# Altium integrated library ICs.IntLib: 88 symbols (part 1 of 2) (continued)
## LM5111-1M
designator U?
MosFET gate driver, 5A; Deliverer PartNr: 8238693; Manufacturer: TI; Deliverer: Farnell; TDE-PN: IC0066; Published: 11.11.2015; PackageDescription: SOIC8; Publisher: Sebastian Kulik; Manufacturer PartNr: LM5111-1M
footprint SOIC8_N (SOIC, 8-Leads, Body 4.9x3.9mm, Pitch 1.27mm, IPC Medium Density)
pins: 1 NC, 2 IN_A, 3 Vee, 4 IN_B, 5 OUT_B, 6 Vcc, 7 OUT_A, 8 NC (power)

## LM5111-1M_1
designator U?, comment LM5111-1M
MosFET gate driver, 5A; Deliverer PartNr: 8238693; Manufacturer: TI; Deliverer: Farnell; TDE-PN: IC0066; Published: 11.11.2015; PackageDescription: SOIC8; Publisher: Sebastian Kulik; Manufacturer PartNr: LM5111-1M
footprint SOIC8_N (SOIC, 8-Leads, Body 4.9x3.9mm, Pitch 1.27mm, IPC Medium Density)
pins: 1 NC, 2 IN_A, 3 Vee, 4 IN_B, 5 OUT_B, 6 Vcc, 7 OUT_A, 8 NC (power)

## LM5116HJD
designator U?
Step-Down controller, wide range input, HT; Deliverer PartNr: 595-LM5116HJD; Manufacturer: TI; Deliverer: Mouser; TDE-PN: IC0074; Published: 02.05.2016; PackageDescription: DIP-20-Ceramic-HT; Publisher: Sebastian Kulik; Manufacturer PartNr: LM5116HJD; Price: 156.14/1
footprint DIP-20-Ceramic-HT (DIP; 20 Leads; Row Spacing 7.62 mm; Pitch 2.54 mm)
pins: 1 Vin, 2 UVLO, 3 RT/Sync, 4 EN, 5 RAMP, 6 AGND, 7 SS, 8 FB, 9 COMP, 10 Vout, 11 DEMB, 12 CS, 13 CSG, 14 PGND, 15 LO, 16 VCC, 17 VCCX, 18 HB, 19 HO, 20 SW

## LM5116MH
designator U?
Step-Down controller, wide range input; Deliverer PartNr: 761-5996; Manufacturer: TI; Deliverer: RS; TDE-PN: IC0074; Published: 21.04.2016; PackageDescription: Honeywell-SO8; Publisher: Sebastian Kulik; Manufacturer PartNr: LM5116MH
footprint PWP0020A
pins: 1 Vin, 2 UVLO, 3 RT/Sync, 4 EN, 5 RAMP, 6 AGND, 7 SS, 8 FB, 9 COMP, 10 Vout, 11 DEMB, 12 CS, 13 CSG, 14 PGND, 15 LO, 16 VCC, 17 VCCX, 18 HB, 19 HO, 20 SW, 21 Thermal

## LM22670MR-ADJ
designator U?
TI, step down converter, 3A max; Deliverer PartNr: 1657735; Deliverer: Farnell; TDE-PN: IC0020; Published: 26.03.2014; PackageDescription: PSOP8; Publisher: Sebastian Kulik; Manufacturer PartNr: LM22670MR-ADJ; Manufacturer: TI
footprint PSOP8 (SOIC, 8-Leads, Body 4.9x3.9mm, Pitch 1.27mm, IPC High Density)
pins: 1 BOOT, 3 SYNC, 4 FB (power), 7 VIN, 8 SW, 9 GND

## LM22673MR-ADJ
designator U?
TI, step down converter, 3A max; Deliverer PartNr: 1657736; Deliverer: Farnell; TDE-PN: IC0021; Published: 28.03.2014; PackageDescription: PSOP8; Publisher: Sebastian Kulik; Manufacturer PartNr: LM22673MR-ADJ; Manufacturer: TI
footprint PSOP8 (SOIC, 8-Leads, Body 4.9x3.9mm, Pitch 1.27mm, IPC High Density)
pins: 1 BOOT, 3 SYNC, 4 FB (power), 7 VIN, 8 SW, 9 GND

## MAX3232CSE
designator U?
RS232 transceiver; Deliverer PartNr: 9725490; Manufacturer PartNr: MAX3232CSE+; Manufacturer: Maxim; Deliverer: Farnell; TDE-PN: IC0044; Published: 14.03.2014; PackageDescription: SOIC16_L; Publisher: Sebastian Kulik
footprint SOIC16_L (SOIC, 16-Leads, Body 9.9x3.9mm, Pitch 1.27mm, IPC High Density)
pins: 1 C1+, 2 V+, 3 C1-, 4 C2+, 5 C2-, 6 V-, 7 T2OUT, 8 R2IN, 9 R2OUT, 10 T2IN, 11 T1IN, 12 R1OUT, 13 R1IN, 14 T1OUT, 15 GND, 16 VCC

## MC7805ACTG
designator U?
LDO, 5V; Deliverer PartNr: 9664505; Manufacturer PartNr: ADM811LARTZ-REEL7; Manufacturer: ON-Semi; Deliverer: Farnell; TDE-PN: IC0055; Published: 04.11.2014; PackageDescription: TO220-3; Publisher: Sebastian Kulik
footprint TO220-3
pins: GND, VIN Vin, VOUT Vout (power)

## MCP23017-E/SO
designator U?
I2C mux, 16 bit; Deliverer PartNr: 1332087; Manufacturer: Microchip; Deliverer: Farnell; TDE-PN: IC0049; Published: 23.05.2014; PackageDescription: SSOP28; Publisher: Sebastian Kulik; Manufacturer PartNr: MCP23017-E/SO
footprint SSOP-28 (SSOP, Plastic; 28 Leads; Body Width 5.2 mm; Pitch 0.65 mm)
pins: 1 GPB0, 2 GPB1, 3 GPB2, 4 GPB3, 5 GPB4, 6 GPB5, 7 GPB6, 8 GPB7, 9 Vdd (power), 10 Vss (power), 11 NC (power), 12 SCL, 13 SDA (power), 14 NC, 15 A0, 16 A1, 17 A2, 18 RESET, 19 INTB, 20 INTA, 21 GPA0, 22 GPA1, 23 GPA2, 24 GPA3, 25 GPA4, 26 GPA5, 27 GPA6, 28 GPA7

## MCT5211-X017T
designator U?
OC, low current input; Manufacturer: Vishay; Deliverer: EBV; TDE-PN: IC0053; Published: 07.08.2014; Deliverer PartNr: MCT5211-X017T; PackageDescription: SMD6; Publisher: Sebastian Kulik; Manufacturer PartNr: MCT5211-X017T
footprint SMD-6
pins: 1 A, 2 GND, 3 C, 4 E, 5 C, 6 B

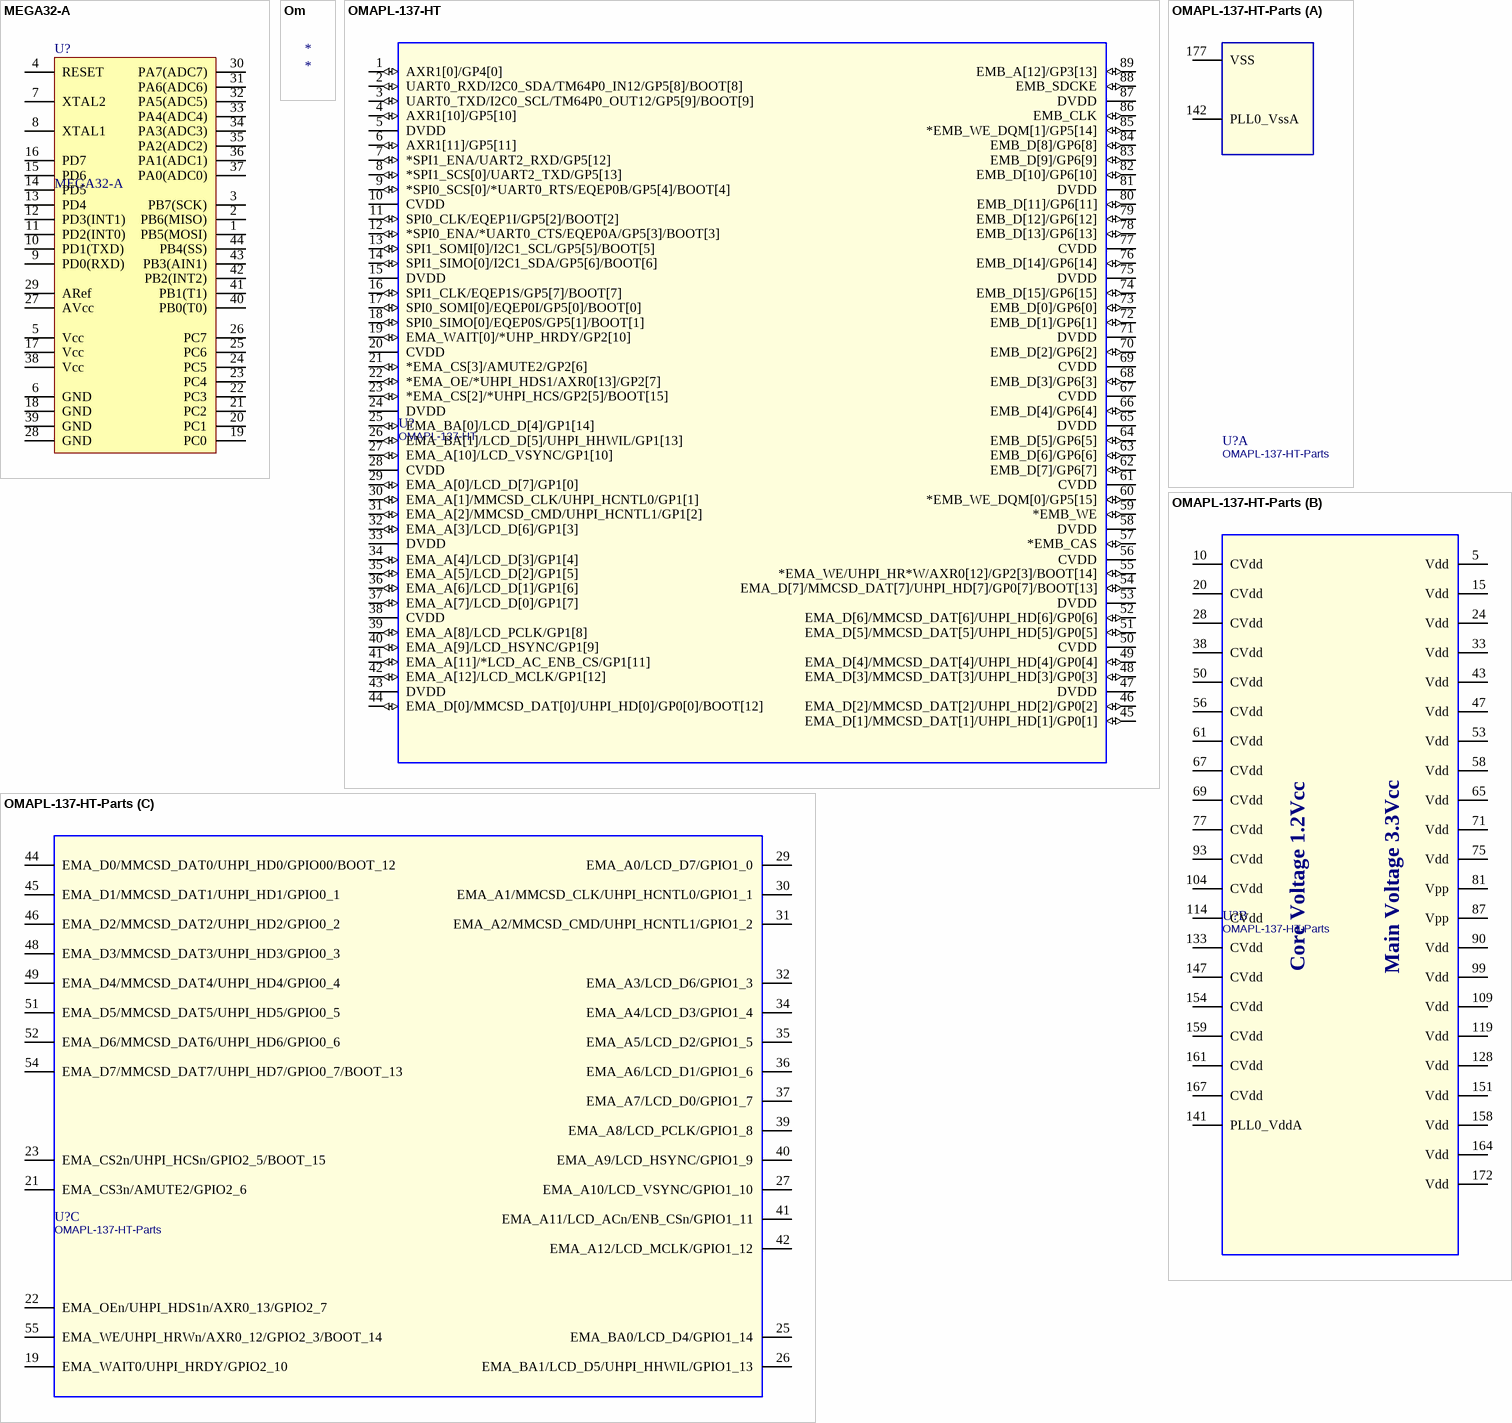
[diagram p3: symbols MEGA32-A to OMAPL-137-HT-Parts]

## MEGA32-A
designator U?
TI, step down converter, 3A max; Manufacturer: Atmel; TDE-PN: IC0057; Published: 10.11.2014; Deliverer PartNr: ?; Deliverer: ?; PackageDescription: TQFP-44; Publisher: Sebastian Kulik; Manufacturer PartNr: ?
footprint TQFP44-N (Thin QFP, 44-Leads, Body 10x10mm, Pitch 0.8mm, IPC Low Density)
pins: 1 PB5(MOSI), 2 PB6(MISO), 3 PB7(SCK), 4 RESET, 5 Vcc, 6 GND, 7 XTAL2, 8 XTAL1, 9 PD0(RXD), 10 PD1(TXD), 11 PD2(INT0), 12 PD3(INT1), 13 PD4, 14 PD5, 15 PD6, 16 PD7, 17 Vcc, 18 GND, 19 PC0, 20 PC1, 21 PC2, 22 PC3, 23 PC4, 24 PC5, 25 PC6, 26 PC7, 27 AVcc, 28 GND, 29 ARef (power), 30 PA7(ADC7), 31 PA6(ADC6), 32 PA5(ADC5), 33 PA4(ADC4), 34 PA3(ADC3), 35 PA2(ADC2), 36 PA1(ADC1), 37 PA0(ADC0), 38 Vcc, 39 GND, 40 PB0(T0), 41 PB1(T1), 42 PB2(INT2), 43 PB3(AIN1), 44 PB4(SS)

## Om
designator *
footprint Om-5mm

## OMAPL-137-HT
designator U?
Manufacturer: TI; Manufacturer PartNr: OMAPL137BPTPH; TDE-PN: IC0081; Deliverer: *; Deliverer PartNr: *; Published: 10.08.2016; Publisher: Sebastian Kulik; Price: *
footprint PTP176_5P73X7P00
footprint PTP176_5P73X7P01
footprint PTP176_5P73X7P31
pins: 1 AXR1[0]/GP4[0] (io), 2 UART0_RXD/I2C0_SDA/TM64P0_IN12/GP5[8]/BOOT[8] (io), 3 UART0_TXD/I2C0_SCL/TM64P0_OUT12/GP5[9]/BOOT[9] (io), 4 AXR1[10]/GP5[10] (io), 5 DVDD (power), 6 AXR1[11]/GP5[11] (io), 7 *SPI1_ENA/UART2_RXD/GP5[12] (io), 8 *SPI1_SCS[0]/UART2_TXD/GP5[13] (io), 9 *SPI0_SCS[0]/*UART0_RTS/EQEP0B/GP5[4]/BOOT[4] (io), 10 CVDD (power), 11 SPI0_CLK/EQEP1I/GP5[2]/BOOT[2] (io), 12 *SPI0_ENA/*UART0_CTS/EQEP0A/GP5[3]/BOOT[3] (io), 13 SPI1_SOMI[0]/I2C1_SCL/GP5[5]/BOOT[5] (io), 14 SPI1_SIMO[0]/I2C1_SDA/GP5[6]/BOOT[6] (io), 15 DVDD (power), 16 SPI1_CLK/EQEP1S/GP5[7]/BOOT[7] (io), 17 SPI0_SOMI[0]/EQEP0I/GP5[0]/BOOT[0] (io), 18 SPI0_SIMO[0]/EQEP0S/GP5[1]/BOOT[1] (io), 19 EMA_WAIT[0]/*UHP_HRDY/GP2[10] (io), 20 CVDD (power), 21 *EMA_CS[3]/AMUTE2/GP2[6] (io), 22 *EMA_OE/*UHPI_HDS1/AXR0[13]/GP2[7] (io), 23 *EMA_CS[2]/*UHPI_HCS/GP2[5]/BOOT[15] (io), 24 DVDD (power), 25 EMA_BA[0]/LCD_D[4]/GP1[14] (io), 26 EMA_BA[1]/LCD_D[5]/UHPI_HHWIL/GP1[13] (io), 27 EMA_A[10]/LCD_VSYNC/GP1[10] (io), 28 CVDD (power), 29 EMA_A[0]/LCD_D[7]/GP1[0] (io), 30 EMA_A[1]/MMCSD_CLK/UHPI_HCNTL0/GP1[1] (io), 31 EMA_A[2]/MMCSD_CMD/UHPI_HCNTL1/GP1[2] (io), 32 EMA_A[3]/LCD_D[6]/GP1[3] (io), 33 DVDD (power), 34 EMA_A[4]/LCD_D[3]/GP1[4] (io), 35 EMA_A[5]/LCD_D[2]/GP1[5] (io), 36 EMA_A[6]/LCD_D[1]/GP1[6] (io), 37 EMA_A[7]/LCD_D[0]/GP1[7] (io), 38 CVDD (power), 39 EMA_A[8]/LCD_PCLK/GP1[8] (io), 40 EMA_A[9]/LCD_HSYNC/GP1[9] (io), 41 EMA_A[11]/*LCD_AC_ENB_CS/GP1[11] (io), 42 EMA_A[12]/LCD_MCLK/GP1[12] (io), 43 DVDD (power), 44 EMA_D[0]/MMCSD_DAT[0]/UHPI_HD[0]/GP0[0]/BOOT[12] (io), 45 EMA_D[1]/MMCSD_DAT[1]/UHPI_HD[1]/GP0[1] (io), 46 EMA_D[2]/MMCSD_DAT[2]/UHPI_HD[2]/GP0[2] (io), 47 DVDD (power), 48 EMA_D[3]/MMCSD_DAT[3]/UHPI_HD[3]/GP0[3] (io), 49 EMA_D[4]/MMCSD_DAT[4]/UHPI_HD[4]/GP0[4] (io), 50 CVDD (power), 51 EMA_D[5]/MMCSD_DAT[5]/UHPI_HD[5]/GP0[5] (io), 52 EMA_D[6]/MMCSD_DAT[6]/UHPI_HD[6]/GP0[6] (io), 53 DVDD (power), 54 EMA_D[7]/MMCSD_DAT[7]/UHPI_HD[7]/GP0[7]/BOOT[13] (io), 55 *EMA_WE/UHPI_HR*W/AXR0[12]/GP2[3]/BOOT[14] (io), 56 CVDD (power), 57 *EMB_CAS (io), 58 DVDD (power), 59 *EMB_WE (io), 60 *EMB_WE_DQM[0]/GP5[15] (io), 61 CVDD (power), 62 EMB_D[7]/GP6[7] (io), 63 EMB_D[6]/GP6[6] (io), 64 EMB_D[5]/GP6[5] (io), 65 DVDD (power), 66 EMB_D[4]/GP6[4] (io), 67 CVDD (power), 68 EMB_D[3]/GP6[3] (io), 69 CVDD (power), 70 EMB_D[2]/GP6[2] (io), 71 DVDD (power), 72 EMB_D[1]/GP6[1] (io), 73 EMB_D[0]/GP6[0] (io), 74 EMB_D[15]/GP6[15] (io), 75 DVDD (power), 76 EMB_D[14]/GP6[14] (io), 77 CVDD (power), 78 EMB_D[13]/GP6[13] (io), 79 EMB_D[12]/GP6[12] (io), 80 EMB_D[11]/GP6[11] (io), 81 DVDD (power), 82 EMB_D[10]/GP6[10] (io), 83 EMB_D[9]/GP6[9] (io), 84 EMB_D[8]/GP6[8] (io), 85 *EMB_WE_DQM[1]/GP5[14] (io), 86 EMB_CLK (io), 87 DVDD (power), 88 EMB_SDCKE (io), 89 EMB_A[12]/GP3[13] (io)

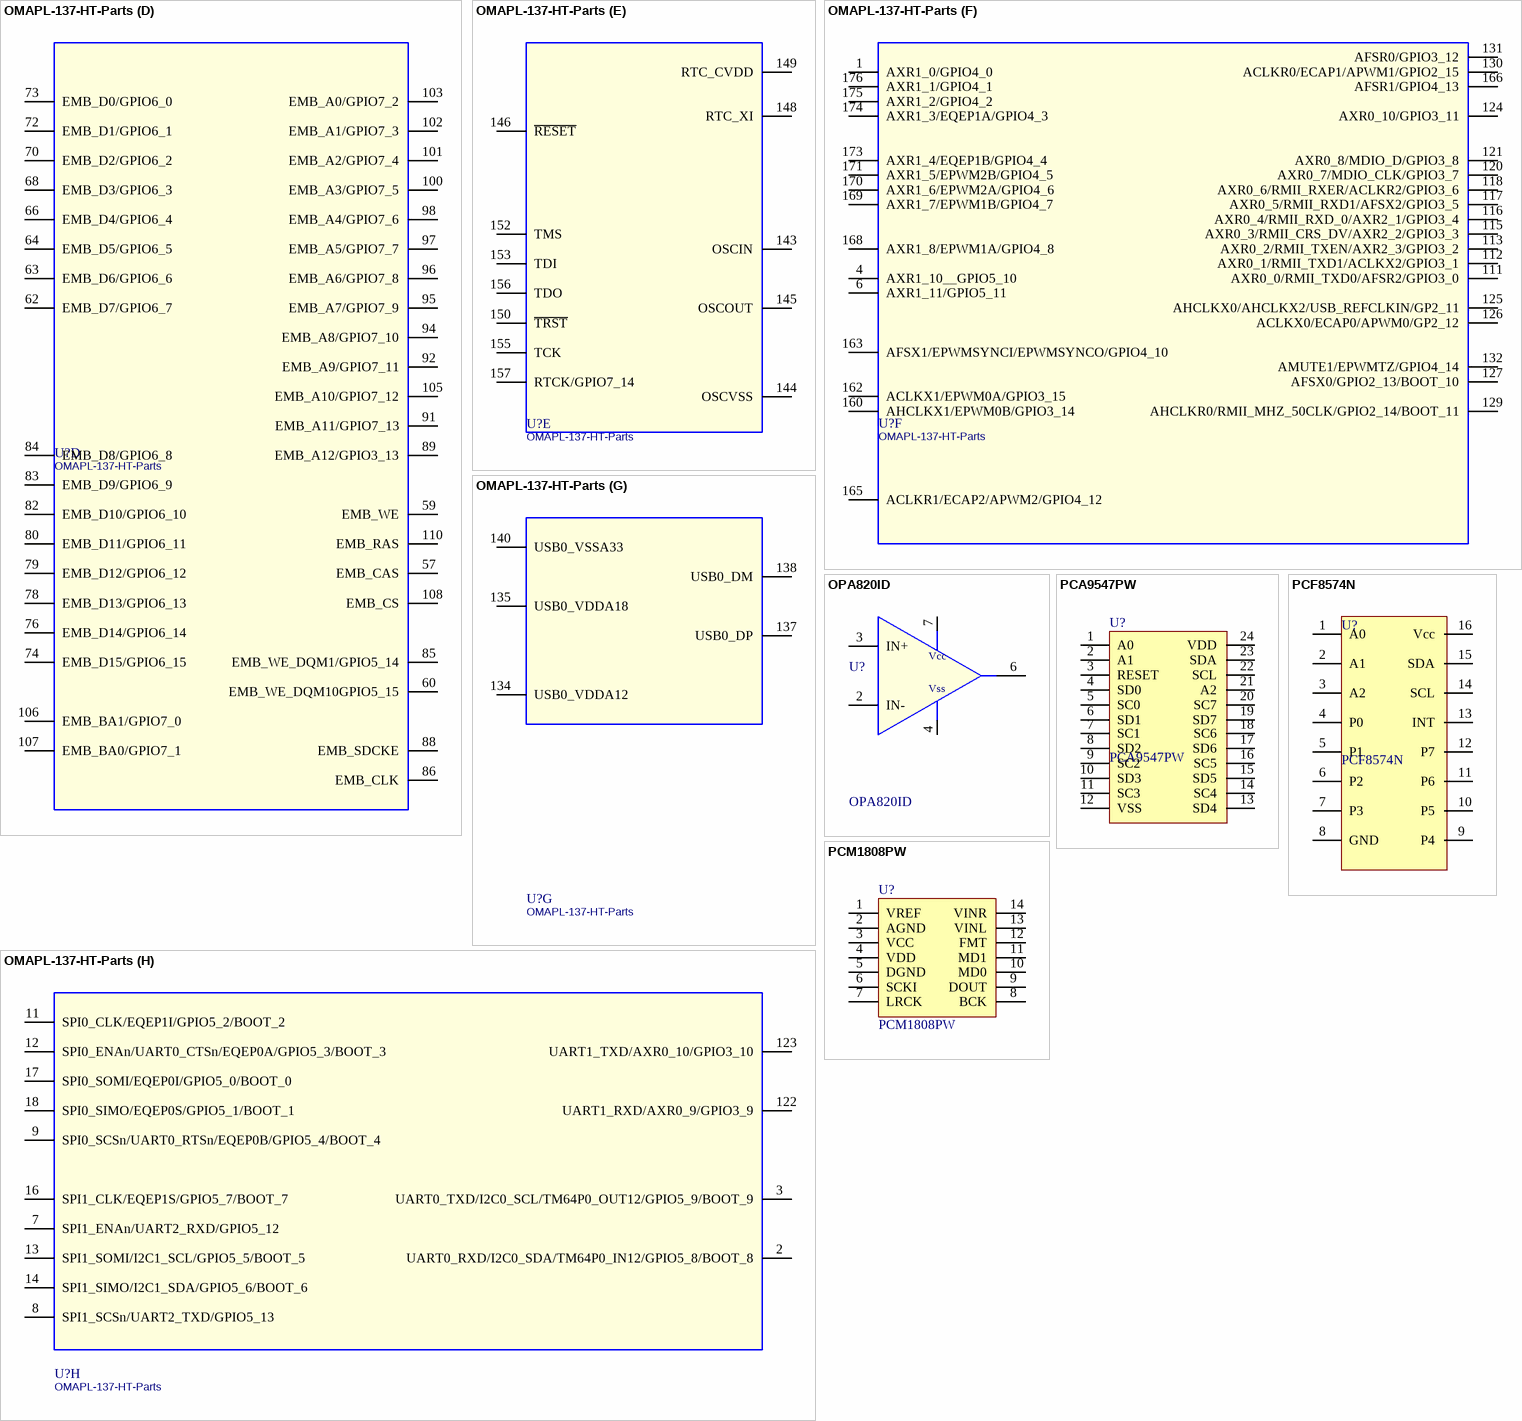
[diagram p4: symbols OMAPL-137-HT-Parts to PCM1808PW]

## OMAPL-137-HT-Parts
designator U?
Manufacturer: TI; Manufacturer PartNr: OMAPL137BPTPH; TDE-PN: IC0081; Deliverer: *; Deliverer PartNr: *; Published: 10.08.2016; Publisher: Sebastian Kulik; Price: *
footprint PTP176_5P73X7P00
footprint PTP176_5P73X7P01
footprint PTP176_5P73X7P31
part A pins: 142 PLL0_VssA (power), 177 VSS (power)
part B pins: 5 Vdd (power), 10 CVdd (power), 15 Vdd (power), 20 CVdd (power), 24 Vdd (power), 28 CVdd (power), 33 Vdd (power), 38 CVdd (power), 43 Vdd (power), 47 Vdd (power), 50 CVdd (power), 53 Vdd (power), 56 CVdd (power), 58 Vdd (power), 61 CVdd (power), 65 Vdd (power), 67 CVdd (power), 69 CVdd (power), 71 Vdd (power), 75 Vdd (power), 77 CVdd (power), 81 Vpp (power), 87 Vpp (power), 90 Vdd (power), 93 CVdd (power), 99 Vdd (power), 104 CVdd (power), 109 Vdd (power), 114 CVdd (power), 119 Vdd (power), 128 Vdd (power), 133 CVdd, 141 PLL0_VddA (power), 147 CVdd (power), 151 Vdd (power), 154 CVdd (power), 158 Vdd (power), 159 CVdd (power), 161 CVdd (power), 164 Vdd (power), 167 CVdd (power), 172 Vdd (power)
part C pins: 19 EMA_WAIT0/UHPI_HRDY/GPIO2_10, 21 EMA_CS3n/AMUTE2/GPIO2_6, 22 EMA_OEn/UHPI_HDS1n/AXR0_13/GPIO2_7, 23 EMA_CS2n/UHPI_HCSn/GPIO2_5/BOOT_15, 25 EMA_BA0/LCD_D4/GPIO1_14, 26 EMA_BA1/LCD_D5/UHPI_HHWIL/GPIO1_13, 27 EMA_A10/LCD_VSYNC/GPIO1_10, 29 EMA_A0/LCD_D7/GPIO1_0, 30 EMA_A1/MMCSD_CLK/UHPI_HCNTL0/GPIO1_1, 31 EMA_A2/MMCSD_CMD/UHPI_HCNTL1/GPIO1_2, 32 EMA_A3/LCD_D6/GPIO1_3, 34 EMA_A4/LCD_D3/GPIO1_4, 35 EMA_A5/LCD_D2/GPIO1_5, 36 EMA_A6/LCD_D1/GPIO1_6, 37 EMA_A7/LCD_D0/GPIO1_7, 39 EMA_A8/LCD_PCLK/GPIO1_8, 40 EMA_A9/LCD_HSYNC/GPIO1_9, 41 EMA_A11/LCD_ACn/ENB_CSn/GPIO1_11, 42 EMA_A12/LCD_MCLK/GPIO1_12, 44 EMA_D0/MMCSD_DAT0/UHPI_HD0/GPIO00/BOOT_12, 45 EMA_D1/MMCSD_DAT1/UHPI_HD1/GPIO0_1, 46 EMA_D2/MMCSD_DAT2/UHPI_HD2/GPIO0_2, 48 EMA_D3/MMCSD_DAT3/UHPI_HD3/GPIO0_3, 49 EMA_D4/MMCSD_DAT4/UHPI_HD4/GPIO0_4, 51 EMA_D5/MMCSD_DAT5/UHPI_HD5/GPIO0_5, 52 EMA_D6/MMCSD_DAT6/UHPI_HD6/GPIO0_6, 54 EMA_D7/MMCSD_DAT7/UHPI_HD7/GPIO0_7/BOOT_13, 55 EMA_WE/UHPI_HRWn/AXR0_12/GPIO2_3/BOOT_14
part D pins: 57 EMB_CAS, 59 EMB_WE, 60 EMB_WE_DQM10GPIO5_15, 62 EMB_D7/GPIO6_7, 63 EMB_D6/GPIO6_6, 64 EMB_D5/GPIO6_5, 66 EMB_D4/GPIO6_4, 68 EMB_D3/GPIO6_3, 70 EMB_D2/GPIO6_2, 72 EMB_D1/GPIO6_1, 73 EMB_D0/GPIO6_0, 74 EMB_D15/GPIO6_15, 76 EMB_D14/GPIO6_14, 78 EMB_D13/GPIO6_13, 79 EMB_D12/GPIO6_12, 80 EMB_D11/GPIO6_11, 82 EMB_D10/GPIO6_10, 83 EMB_D9/GPIO6_9, 84 EMB_D8/GPIO6_8, 85 EMB_WE_DQM1/GPIO5_14, 86 EMB_CLK, 88 EMB_SDCKE, 89 EMB_A12/GPIO3_13, 91 EMB_A11/GPIO7_13, 92 EMB_A9/GPIO7_11, 94 EMB_A8/GPIO7_10, 95 EMB_A7/GPIO7_9, 96 EMB_A6/GPIO7_8, 97 EMB_A5/GPIO7_7, 98 EMB_A4/GPIO7_6, 100 EMB_A3/GPIO7_5, 101 EMB_A2/GPIO7_4, 102 EMB_A1/GPIO7_3, 103 EMB_A0/GPIO7_2, 105 EMB_A10/GPIO7_12, 106 EMB_BA1/GPIO7_0, 107 EMB_BA0/GPIO7_1, 108 EMB_CS, 110 EMB_RAS
part E pins: 143 OSCIN, 144 OSCVSS (power), 145 OSCOUT, 146 ~{RESET}, 148 RTC_XI, 149 RTC_CVDD (power), 150 ~{TRST}, 152 TMS, 153 TDI, 155 TCK, 156 TDO, 157 RTCK/GPIO7_14
part F pins: 1 AXR1_0/GPIO4_0, 4 AXR1_10__GPIO5_10, 6 AXR1_11/GPIO5_11, 111 AXR0_0/RMII_TXD0/AFSR2/GPIO3_0, 112 AXR0_1/RMII_TXD1/ACLKX2/GPIO3_1, 113 AXR0_2/RMII_TXEN/AXR2_3/GPIO3_2, 115 AXR0_3/RMII_CRS_DV/AXR2_2/GPIO3_3, 116 AXR0_4/RMII_RXD_0/AXR2_1/GPIO3_4, 117 AXR0_5/RMII_RXD1/AFSX2/GPIO3_5, 118 AXR0_6/RMII_RXER/ACLKR2/GPIO3_6, 120 AXR0_7/MDIO_CLK/GPIO3_7, 121 AXR0_8/MDIO_D/GPIO3_8, 124 AXR0_10/GPIO3_11, 125 AHCLKX0/AHCLKX2/USB_REFCLKIN/GP2_11, 126 ACLKX0/ECAP0/APWM0/GP2_12, 127 AFSX0/GPIO2_13/BOOT_10, 129 AHCLKR0/RMII_MHZ_50CLK/GPIO2_14/BOOT_11, 130 ACLKR0/ECAP1/APWM1/GPIO2_15, 131 AFSR0/GPIO3_12, 132 AMUTE1/EPWMTZ/GPIO4_14, 160 AHCLKX1/EPWM0B/GPIO3_14, 162 ACLKX1/EPWM0A/GPIO3_15, 163 AFSX1/EPWMSYNCI/EPWMSYNCO/GPIO4_10, 165 ACLKR1/ECAP2/APWM2/GPIO4_12, 166 AFSR1/GPIO4_13, 168 AXR1_8/EPWM1A/GPIO4_8, 169 AXR1_7/EPWM1B/GPIO4_7, 170 AXR1_6/EPWM2A/GPIO4_6, 171 AXR1_5/EPWM2B/GPIO4_5, 173 AXR1_4/EQEP1B/GPIO4_4, 174 AXR1_3/EQEP1A/GPIO4_3, 175 AXR1_2/GPIO4_2, 176 AXR1_1/GPIO4_1
part G pins: 134 USB0_VDDA12, 135 USB0_VDDA18, 137 USB0_DP, 138 USB0_DM, 140 USB0_VSSA33
part H pins: 2 UART0_RXD/I2C0_SDA/TM64P0_IN12/GPIO5_8/BOOT_8, 3 UART0_TXD/I2C0_SCL/TM64P0_OUT12/GPIO5_9/BOOT_9, 7 SPI1_ENAn/UART2_RXD/GPIO5_12, 8 SPI1_SCSn/UART2_TXD/GPIO5_13, 9 SPI0_SCSn/UART0_RTSn/EQEP0B/GPIO5_4/BOOT_4, 11 SPI0_CLK/EQEP1I/GPIO5_2/BOOT_2, 12 SPI0_ENAn/UART0_CTSn/EQEP0A/GPIO5_3/BOOT_3, 13 SPI1_SOMI/I2C1_SCL/GPIO5_5/BOOT_5, 14 SPI1_SIMO/I2C1_SDA/GPIO5_6/BOOT_6, 16 SPI1_CLK/EQEP1S/GPIO5_7/BOOT_7, 17 SPI0_SOMI/EQEP0I/GPIO5_0/BOOT_0, 18 SPI0_SIMO/EQEP0S/GPIO5_1/BOOT_1, 122 UART1_RXD/AXR0_9/GPIO3_9, 123 UART1_TXD/AXR0_10/GPIO3_10
part B text: Core Voltage 1.2Vcc; Main Voltage 3.3Vcc

## OPA820ID
designator U?
High speed OP, 260MHz; Deliverer PartNr: 661-1053; Manufacturer: TI; Deliverer: RS; TDE-PN: IC00077; Published: 31.05.2016; PackageDescription: TSSOP8; Publisher: Sebastian Kulik; Manufacturer PartNr: OPA820ID; Price: 2.548/5
footprint TSSOP8 (Shrink Small Outline, Plastic, Thin; 8 Leads; Body Width 4.4 mm; Pitch 0.65 mm)
footprint SOIC8_N (SOIC, 8-Leads, Body 4.9x3.9mm, Pitch 1.27mm, IPC Medium Density)
footprint SOP8_L (SOIC, 8-Leads, Body 4.9x3.9mm, Pitch 1.27mm, IPC High Density)
pins: 2 IN-, 3 IN+ (power), 4 Vss, 6 OUT, 7 Vcc

## PCA9547PW
designator U?
I2C mux; Deliverer PartNr: 2212121; Manufacturer: NXP; Deliverer: Farnell; TDE-PN: IC0030; Published: 28.02.2014; PackageDescription: TSSOP24-W; Publisher: Sebastian Kulik; Manufacturer PartNr: PCA9547PW
footprint TSSOP24-W
pins: 1 A0, 2 A1, 3 RESET, 4 SD0, 5 SC0, 6 SD1, 7 SC1, 8 SD2 (power), 9 SC2 (power), 10 SD3 (power), 11 SC3 (power), 12 VSS (power), 13 SD4 (power), 14 SC4, 15 SD5, 16 SC5, 17 SD6, 18 SC6, 19 SD7, 20 SC7, 21 A2, 22 SCL, 23 SDA, 24 VDD

## PCF8574N
designator U?
I2C 8-bit expander; Deliverer PartNr: 517-0687; Manufacturer: TI; Deliverer: RS; TDE-PN: IC0079; Published: 18.07.2016; PackageDescription: DIP16; Publisher: Sebastian Kulik; Manufacturer PartNr: PCF8574N; Price: 1.34/5
footprint DIP-16 (DIP; 16 Leads; Row Spacing 7.62 mm; Pitch 2.54 mm)
pins: 1 A0, 2 A1, 3 A2, 4 P0, 5 P1, 6 P2, 7 P3, 8 GND (power), 9 P4 (power), 10 P5 (power), 11 P6 (power), 12 P7 (power), 13 INT, 14 SCL, 15 SDA (power), 16 Vcc

## PCM1808PW
designator U?
TI, step down converter, 3A max; Deliverer PartNr: 1754965; Deliverer: Farnell; TDE-PN: IC0023; Published: 28.03.2014; PackageDescription: TSSOP-14-W; Publisher: Sebastian Kulik; Manufacturer PartNr: PCM1808PW; Manufacturer: TI
footprint TSSOP-14-W
pins: 1 VREF, 2 AGND, 3 VCC, 4 VDD (power), 5 DGND, 6 SCKI, 7 LRCK, 8 BCK, 9 DOUT, 10 MD0, 11 MD1, 12 FMT, 13 VINL, 14 VINR

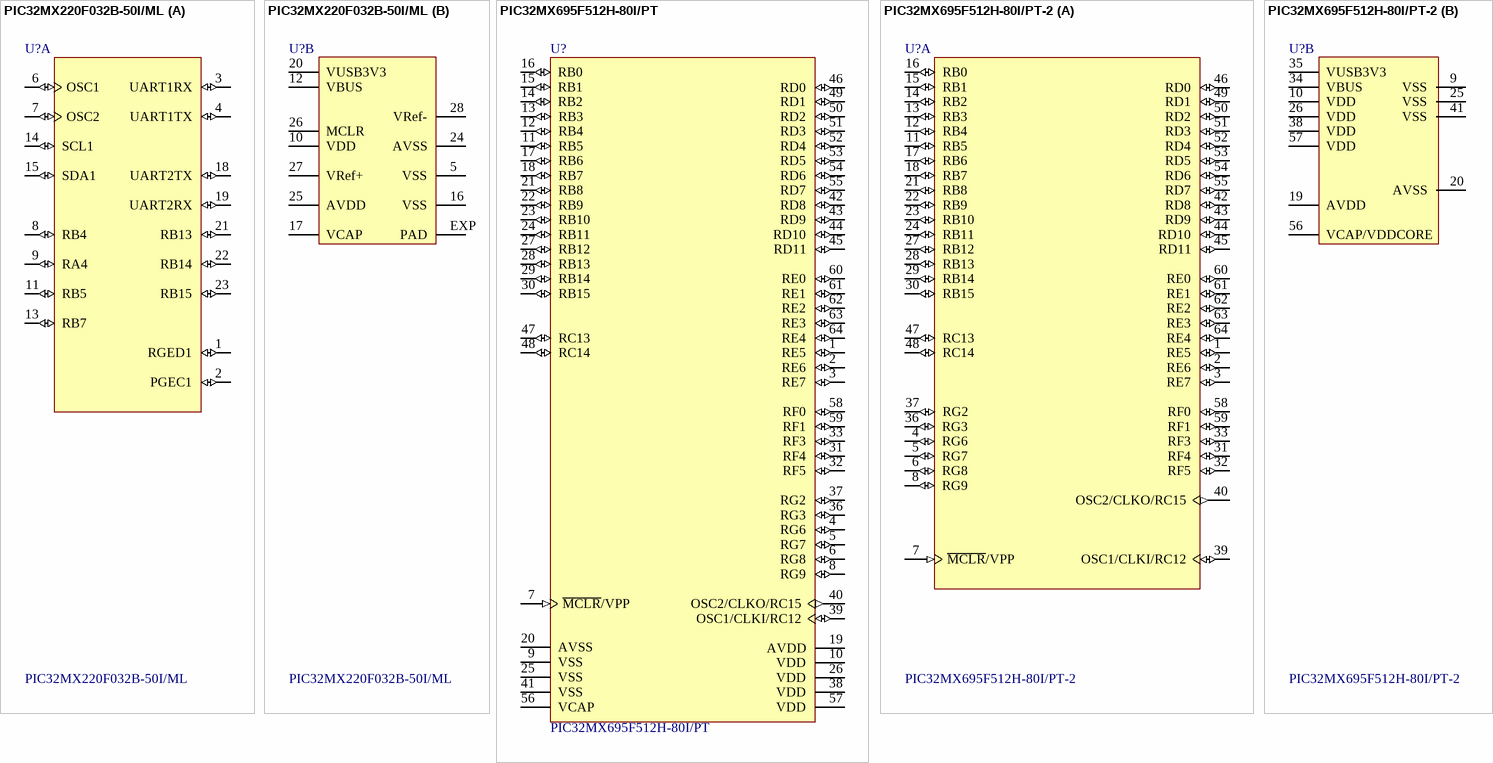
[diagram p5: symbols PIC32MX220F032B-50I/ML to PIC32MX695F512H-80I/PT-2]

## PIC32MX220F032B-50I/ML
designator U?
High Performance ROM-less Microcontroller; Deliverer PartNr: 2357345; Manufacturer: Microchip; Deliverer: Farnell; TDE-PN: IC0063; Published: 19.01.2015; PackageDescription: QFN28; Publisher: Sebastian Kulik; Manufacturer PartNr: PIC32MX220F032B-50I/ML
footprint QFN28_LONG_ERRLES-Vias (QFN28_LONG_ERRLES)
part A pins: 1 RGED1 (io), 2 PGEC1 (io), 3 UART1RX (io), 4 UART1TX (io), 6 OSC1 (io), 7 OSC2 (io), 8 RB4 (io), 9 RA4 (io), 11 RB5 (io), 13 RB7 (io), 14 SCL1 (io), 15 SDA1 (io), 18 UART2TX (io), 19 UART2RX (io), 21 RB13 (io), 22 RB14 (io), 23 RB15 (io)
part B pins: 5 VSS (power) "Ground reference for logic, I/O pins, and USB. This pin  must be connected at all times.", 10 VDD (power) "Positive supply for peripheral logic and I/O pins. This  pin must be connected at all times.", 12 VBUS (power) "USB bus power monitor", 16 VSS (power) "Ground reference for logic, I/O pins, and USB. This pin  must be connected at all times.", 17 VCAP (power) "Positive supply for analog modules. This pin must be  connected at all times.", 20 VUSB3V3 (power) "USB internal transceiver supply. If the USB module is  not used, this pin must be connected to VSS.", 24 AVSS (power) "Ground reference for analog modules. This pin must  be connected at all times", 25 AVDD (power) "Positive supply for analog modules. This pin must be  connected at all times.", 26 MCLR "Positive supply for analog modules. This pin must be  connected at all times.", 27 VRef+ (power) "Positive supply for analog modules. This pin must be  connected at all times.", 28 VRef- (power) "Positive supply for analog modules. This pin must be  connected at all times.", EXP PAD (power) "Ground reference for logic, I/O pins, and USB. This pin  must be connected at all times."

## PIC32MX695F512H-80I/PT
designator U?
High Performance ROM-less Microcontroller with External Memory Bus, 1.5K RAM, 64-Pin TQFP, 4.2 to 5.5V Supply Range, Industrial Temperature; Deliverer PartNr: 1778975; Manufacturer: Microchip; Deliverer: Farnell; TDE-PN: IC0031; Published: 11.02.2014; PackageReference: TQFP-64; Publisher: Sebastian Kulik; PackageDescription: 64-Pin Thin Plastic Quad Flat Pack 0.5 mm Pitch, 1.0/0.1 mm Lead Form; Manufacturer PartNr: PIC32MX695F512H-80I/PT
footprint TQFP-64_N1 (64-Pin Thin Plastic Quad Flat Pack 0.5 mm Pitch, 1.0/0.1 mm Lead Form, IPC Medium Density)
footprint TQFP-64_L1 (64-Pin Thin Plastic Quad Flat Pack 0.5 mm Pitch, 1.0/0.1 mm Lead Form, IPC High Density)
footprint TQFP-64_M1 (64-Pin Thin Plastic Quad Flat Pack 0.5 mm Pitch, 1.0/0.1 mm Lead Form, IPC Low Density)
pins: 1 RE5 (io), 2 RE6 (io), 3 RE7 (io), 4 RG6 (io), 5 RG7 (io), 6 RG8 (io), 7 ~{MCLR}/VPP (in), 8 RG9 (io), 9 VSS (power), 10 VDD (power), 11 RB5 (io), 12 RB4 (io), 13 RB3 (io), 14 RB2 (io), 15 RB1 (io), 16 RB0 (io), 17 RB6 (io), 18 RB7 (io), 19 AVDD (power), 20 AVSS (power), 21 RB8 (io), 22 RB9 (io), 23 RB10 (io), 24 RB11 (io), 25 VSS (power), 26 VDD (power), 27 RB12 (io), 28 RB13 (io), 29 RB14 (io), 30 RB15 (io), 31 RF4 (io), 32 RF5 (io), 33 RF3 (io), 36 RG3 (io), 37 RG2 (io), 38 VDD (power), 39 OSC1/CLKI/RC12 (io), 40 OSC2/CLKO/RC15 (out), 41 VSS (power), 42 RD8 (io), 43 RD9 (io), 44 RD10 (io), 45 RD11 (io), 46 RD0 (io), 47 RC13 (io), 48 RC14 (io), 49 RD1 (io), 50 RD2 (io), 51 RD3 (io), 52 RD4 (io), 53 RD5 (io), 54 RD6 (io), 55 RD7 (io), 56 VCAP (power), 57 VDD (power), 58 RF0 (io), 59 RF1 (io), 60 RE0 (io), 61 RE1 (io), 62 RE2 (io), 63 RE3 (io), 64 RE4 (io)

## PIC32MX695F512H-80I/PT-2
designator U?
High Performance ROM-less Microcontroller with External Memory Bus, 1.5K RAM, 64-Pin TQFP, 4.2 to 5.5V Supply Range, Industrial Temperature; Deliverer PartNr: 1778975; Manufacturer: Microchip; Deliverer: Farnell; TDE-PN: IC0031; Published: 11.02.2014; PackageDescription: TQFP-64; Publisher: Sebastian Kulik; PackageDescription: 64-Pin Thin Plastic Quad Flat Pack 0.5 mm Pitch, 1.0/0.1 mm Lead Form; Manufacturer PartNr: PIC32MX695F512H-80I/PT
footprint TQFP-64_N1 (64-Pin Thin Plastic Quad Flat Pack 0.5 mm Pitch, 1.0/0.1 mm Lead Form, IPC Medium Density)
footprint TQFP-64_L1 (64-Pin Thin Plastic Quad Flat Pack 0.5 mm Pitch, 1.0/0.1 mm Lead Form, IPC High Density)
footprint TQFP-64_M1 (64-Pin Thin Plastic Quad Flat Pack 0.5 mm Pitch, 1.0/0.1 mm Lead Form, IPC Low Density)
part A pins: 1 RE5 (io), 2 RE6 (io), 3 RE7 (io), 4 RG6 (io), 5 RG7 (io), 6 RG8 (io), 7 ~{MCLR}/VPP (in), 8 RG9 (io), 11 RB5 (io), 12 RB4 (io), 13 RB3 (io), 14 RB2 (io), 15 RB1 (io), 16 RB0 (io), 17 RB6 (io), 18 RB7 (io), 21 RB8 (io), 22 RB9 (io), 23 RB10 (io), 24 RB11 (io), 27 RB12 (io), 28 RB13 (io), 29 RB14 (io), 30 RB15 (io), 31 RF4 (io), 32 RF5 (io), 33 RF3 (io), 36 RG3 (io), 37 RG2 (io), 39 OSC1/CLKI/RC12 (io), 40 OSC2/CLKO/RC15 (out), 42 RD8 (io), 43 RD9 (io), 44 RD10 (io), 45 RD11 (io), 46 RD0 (io), 47 RC13 (io), 48 RC14 (io), 49 RD1 (io), 50 RD2 (io), 51 RD3 (io), 52 RD4 (io), 53 RD5 (io), 54 RD6 (io), 55 RD7 (io), 58 RF0 (io), 59 RF1 (io), 60 RE0 (io), 61 RE1 (io), 62 RE2 (io), 63 RE3 (io), 64 RE4 (io)
part B pins: 9 VSS (power) "Ground reference for logic, I/O pins, and USB. This pin  must be connected at all times.", 10 VDD (power) "Positive supply for peripheral logic and I/O pins. This  pin must be connected at all times.", 19 AVDD (power) "Positive supply for analog modules. This pin must be  connected at all times.", 20 AVSS (power) "Ground reference for analog modules. This pin must  be connected at all times", 25 VSS (power) "Ground reference for logic, I/O pins, and USB. This pin  must be connected at all times.", 26 VDD (power) "Positive supply for analog modules. This pin must be  connected at all times.", 34 VBUS (power) "USB bus power monitor", 35 VUSB3V3 (power) "USB internal transceiver supply. If the USB module is  not used, this pin must be connected to VSS.", 38 VDD (power) "Positive supply for analog modules. This pin must be  connected at all times.", 41 VSS (power) "Ground reference for logic, I/O pins, and USB. This pin  must be connected at all times.", 56 VCAP/VDDCORE (power) "Positive supply for analog modules. This pin must be  connected at all times.", 57 VDD (power) "Positive supply for analog modules. This pin must be  connected at all times."
